# Altium footprint library Binh.PcbLib: 863 footprints (part 7 of 54)
Each footprint in its own frame and in the unit in brackets; x right, y up, seen from the top. Pads: shape width x height; smd on the part's side, far side on the other; paste and mask are expansions set on the pad; w line width, h text height; cw(c..) or ccw(c..) is an arc to the next point about the centre after c.
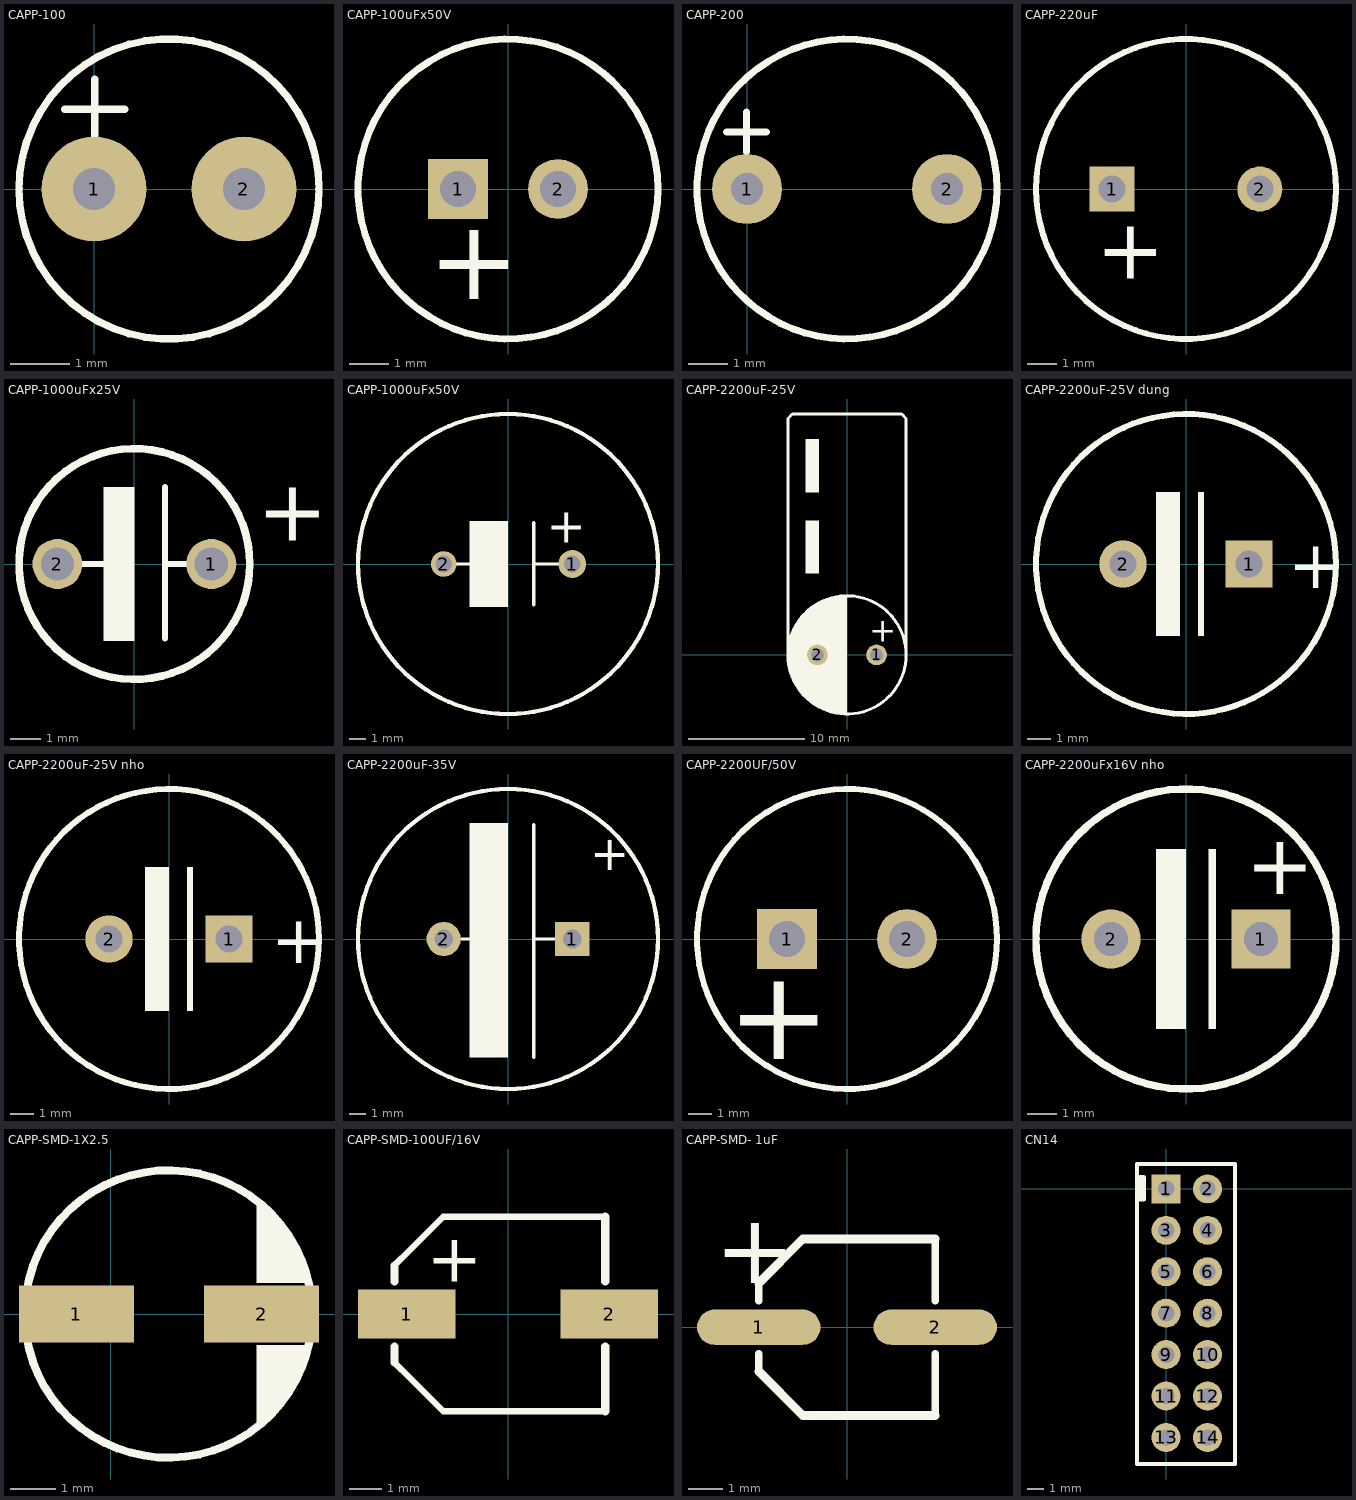
[diagram p6: the footprints below, top view; thin cyan lines are the x and y axes]

## CAPP-100 [mil]
pads (2):
  round 70 hole 28 unplated: 1(0,0) 2(100,0)
Top Overlay:
  circle w5: c50,0 r100
  lines w5: -19.5,53.25 20.5,53.25 ; 0.5,33.25 0.5,73.25

## CAPP-100uFx50V [mil] "Capacitor, tu loc nguon 100uF"
height 649.61
pads (2):
  rect 60x60 hole 36: 1(-50,0)
  round 60 hole 36: 2(50,0)
Top Overlay:
  circle w7: c0,0 r150
  text "+" at -80,-110 h80

## CAPP-200 [mil]
pads (2):
  round 70 hole 32 unplated: 1(0,0) 2(200,0)
Top Overlay:
  circle w7: c100,0 r150
  lines w7: -20.5,57 19.5,57 ; -0.5,37 -0.5,77

## CAPP-220uF [mil] "Capacitor, tu loc nguon 220uF"
height 649.61
pads (2):
  rect 60x60 hole 36: 1(-98.4,0)
  round 60 hole 36: 2(98.4,0)
Top Overlay:
  circle w7.87: c0,0 r200
  text "+" at -120,-120 h80

## CAPP-1000uFx25V [mil]
pads (2):
  round 65 hole 43.31: 1(100,0) 2(-100,0)
Top Overlay:
  circle w10: c0,0 r150
  rectangle: -40,-100 0,100
  lines w7.87: -70.94,0 -20,0 ; 40,-96.85 40,100 ; 41.06,0 70,0
  text "+" at 160,30 h80

## CAPP-1000uFx50V [mil]
pads (2):
  round 65 hole 39.37: 1(150,0)
  round 60 hole 39.37: 2(-150,0)
Top Overlay:
  circle w10: c0,0 r350
  rectangle: -90,-100 0,100
  lines w7.87: -120.94,0 -70,0 ; 60,-95 60,96 ; 61.06,0 120,0
  text "+" at 90,50 h80

## CAPP-2200uF-25V [mil] "2200uFX25V"
pads (2):
  round 70 hole 43.31: 1(100,0) 2(-100,0)
Top Overlay:
  circle w10: c0,0 r200
  rectangle: -50,-195 0,195
  rectangle: -100,-110 -40,100
  rectangle: -140,550 -95,730
  region: -95,455 -140,455 -140,275 -95,275
  lines w10: -200,-5 -200,800 -185,815 185,815 200,800 200,0
  lines w100: -54.85,139.61 ccw(c0,0) -50.45,-141.26
  text "+" at 75,45 h80

## CAPP-2200uF-25V dung [mil] "2200uFX25V dung"
height 500
pads (2):
  rect 78.74x78.74 hole 45: 1(105,0)
  round 78.74 hole 45: 2(-105,0)
Top Overlay:
  circle w10: c0,0 r250
  rectangle: -50,-120 -10,120
  rectangle: 20,-120 30,120
  text "+" at 170,-40 h80

## CAPP-2200uF-25V nho [mm] "2200uFX25V loai nho"
height 20.32
pads (2):
  rect 2x2 hole 1.143: 1(2.54,0)
  round 2 hole 1.143: 2(-2.54,0)
Top Overlay:
  circle w0.254: c0,0 r6.35
  rectangle: 0.762,-3.048 1.016,3.048
  rectangle: -1.016,-3.048 0,3.048
  text "+" at 4.318,-1.016 h2.03

## CAPP-2200uF-35V [mil]
pads (2):
  rect 80x80 hole 43.31: 1(150,0)
  round 80 hole 43.31: 2(-150,0)
Top Overlay:
  circle w10: c0,0 r350
  rectangle: -90,-277 0,271
  lines w7.87: -120.94,0 -70,0 ; 60,-276 60,267 ; 61.06,0 120,0
  text "+" at 192,161 h80

## CAPP-2200UF/50V [mil]
pads (2):
  rect 100x100 hole 60: 1(-100,0)
  round 100 hole 60: 2(100,0)
Top Overlay:
  circle w10: c0,0 r250
  text "+" at -200,-200 h150

## CAPP-2200uFx16V nho [mm] "2200uFX16V loai nho"
height 20.32
pads (2):
  rect 2x2 hole 1.143: 1(2.54,0)
  round 2 hole 1.143: 2(-2.54,0)
Top Overlay:
  circle w0.254: c0,0 r5.08
  rectangle: 0.762,-3.048 1.016,3.048
  rectangle: -1.016,-3.048 0,3.048
  text "+" at 2.032,1.524 h2.03

## CAPP-SMD-1X2.5 [mil] "Tu hoa SMD 33 >100 uF,50V, 220uF/16V,25V"
height 100
pads (2):
  rect 100x50 smd: 1(-30,0) 2(131,0)
Top Overlay:
  circle w7: c50,0 r125
  region: 127,98 127,27 172,27 173,9 170,-26 169.75,-27 127,-27 127,-98 141,-86 156,-67 170,-38 175,-19 175,18 170,37 162,58 146,82
  lines w7: -65,0 -45,0 ; -55,-10 -55,-5 -55,5 -55,10

## CAPP-SMD-100UF/16V [mil]
pads (2):
  rect 120x60 smd: 1(-125,0) 2(125,0)
Top Overlay:
  lines w8: -140,-60 -120,-80 -80,-120 120,-120 ; -140,60 -120,80 -80,120 120,120
  lines w10: -140,-60 -140,-40 ; -140,40 -140,60 ; 120,-120 120,-40 ; 120,40 120,120
  text "+" at -100,40 h60

## CAPP-SMD- 1uF [mil] "TU SMD"
pads (2):
  oval 140x40 smd: 1(-100,0) 2(100,0)
Top Overlay:
  lines w8: -100,-50 -100,-30 ; -100,30 -100,50 ; 100,-100 100,-30 ; 100,30 100,100
  lines w10: -100,-50 -50,-100 100,-100 ; -100,50 -50,100 50,100 100,100
  text "+" at -150,50 h80

## CN14 [mil]
pads (14):
  rect 70x70 hole 39.37 unplated: 1(0,0)
  round 70 hole 39.37 unplated: 2(100,0) 3(0,-100) 4(100,-100) 5(0,-200) 6(100,-200) 7(0,-300) 8(100,-300) 9(0,-400) 10(100,-400) 11(0,-500) 12(100,-500) 13(0,-600) 14(100,-600)
Top Overlay:
  lines w10: -70,-26 -62,-26 ; -70,28 -62,28 ; -62,-26 -62,28 ; -62,-26 -54,-26 -54,28 -62,28 ; -70,-664 166,-664 166,60 0,60 -70,60 -70,-664